# Altium footprint library SAMTEC SMD.PcbLib: 165 footprints (part 14 of 17) (continued)
## SAMTEC_SEAF-50-01-L-08-2-RA-GP-TR [mm] "400 Contacts in 8 rows (50 Pin per Row), Hi-Density Right Angle Open Pin Field Connector (Guide Post Option)" (continued)
  round 0.5 hole 1.3 unplated mask+0.4: MEC1(34.415,0) MEC2(-34.415,0)
  round 1.85 hole 1.15: MEC3(35.435,-6.16) MEC4(35.435,4.38) MEC5(-35.435,-6.16) MEC6(-35.435,4.38)
Top Overlay:
  lines w0.2: -35.179,6.463 -35.179,7.987 35.179,7.987 35.179,6.463 ; -35.014,-10.86 -34.95,-12.13 -33.172,-12.13 -33.109,-10.86 ; -34.867,7.987 -34.417,7.287 -33.967,7.987 ; -33.147,7.987 -33.147,6.463 -41.529,6.463 -41.529,-8.32 -35.09,-8.32 -35.09,-10.86 35.09,-10.86 35.09,-8.32 41.529,-8.32 41.529,6.463 33.147,6.463 33.147,7.987 ; -32.265,-2.732 -32.461,-2.732 -32.461,3.872 32.461,3.872 32.461,-2.732 31.605,-2.732 ; 31.852,-10.86 31.852,-2.732 ; 33.109,-10.86 33.172,-12.13 34.95,-12.13 35.014,-10.86
  text "400" at 33.825,-10.05 h1.2
  text "1" at -31.625,1.35 h1.2
Mechanical 8:
  drawing of 1707 lines, arcs and shapes, not listed
Mechanical 14:
  lines w0.1: -35.179,6.463 -35.179,7.987 35.179,7.987 35.179,6.463 ; -35.014,-10.86 -34.95,-12.13 -33.172,-12.13 -33.109,-10.86 ; -34.867,7.987 -34.417,7.287 -33.967,7.987 ; -33.147,7.987 -33.147,6.463 -41.529,6.463 -41.529,-8.32 -35.09,-8.32 -35.09,-10.86 35.09,-10.86 35.09,-8.32 41.529,-8.32 41.529,6.463 33.147,6.463 33.147,7.987 ; -31.852,-10.86 -31.852,-2.732 ; 31.852,-10.86 31.852,-2.732 ; 33.109,-10.86 33.172,-12.13 34.95,-12.13 35.014,-10.86 ; -32.461,-2.732 -32.461,3.872 32.461,3.872 32.461,-2.732 -32.461,-2.732
  text "400" at 33.825,-10.05 h1.2
  text "1" at -31.625,1.35 h1.2
Mechanical 15:
  lines w0.05: -41.779,-8.57 -35.34,-8.57 -35.34,-11.11 -35.252,-11.11 -35.188,-12.38 -32.935,-12.38 -32.871,-11.11 32.871,-11.11 32.935,-12.38 35.188,-12.38 35.252,-11.11 35.34,-11.11 35.34,-8.57 41.779,-8.57 41.779,6.713 35.429,6.713 35.429,8.237 -35.429,8.237 -35.429,6.713 -41.779,6.713 -41.779,-8.57
3D body "SAMTEC_SEAF-50-01-L-08-2-RA-GP-TR.stp": height 13, standoff -1.5, extent -41.529,-12.13 41.529,7.987

## SAMTEC_SEAF-50-01-L-08-2-RA-TR [mm] "400 Contacts in 8 rows (50 Pin per Row), Hi-Density Right Angle Open Pin Field Connector"
height 12.99
pads (406):
  oval 0.84x0.63 smd paste+0.1: 1(-31.445,0) 2(-31.445,-2.159) 3(-31.445,-3.43) 4(-31.445,-4.7) 5(-31.445,-5.97) 6(-31.445,-7.24) 7(-31.445,-8.51) 8(-31.445,-9.78) 9(-30.175,0) 10(-30.175,-2.159) 11(-30.175,-3.43) 12(-30.175,-4.7) 13(-30.175,-5.97) 14(-30.175,-7.24) 15(-30.175,-8.51) 16(-30.175,-9.78) 17(-28.905,0) 18(-28.905,-2.159) 19(-28.905,-3.43) 20(-28.905,-4.7) 21(-28.905,-5.97) 22(-28.905,-7.24) 23(-28.905,-8.51) 24(-28.905,-9.78) 25(-27.635,0) 26(-27.635,-2.159) 27(-27.635,-3.43) 28(-27.635,-4.7) 29(-27.635,-5.97) 30(-27.635,-7.24) 31(-27.635,-8.51) 32(-27.635,-9.78) 33(-26.365,0) 34(-26.365,-2.159) 35(-26.365,-3.43) 36(-26.365,-4.7) 37(-26.365,-5.97) 38(-26.365,-7.24) 39(-26.365,-8.51) 40(-26.365,-9.78) 41(-25.095,0) 42(-25.095,-2.159) 43(-25.095,-3.43) 44(-25.095,-4.7) 45(-25.095,-5.97) 46(-25.095,-7.24) 47(-25.095,-8.51) 48(-25.095,-9.78) 49(-23.825,0) 50(-23.825,-2.159) 51(-23.825,-3.43) 52(-23.825,-4.7) 53(-23.825,-5.97) 54(-23.825,-7.24) 55(-23.825,-8.51) 56(-23.825,-9.78) 57(-22.555,0) 58(-22.555,-2.159) 59(-22.555,-3.43) 60(-22.555,-4.7) 61(-22.555,-5.97) 62(-22.555,-7.24) 63(-22.555,-8.51) 64(-22.555,-9.78) 65(-21.285,0) 66(-21.285,-2.159) 67(-21.285,-3.43) 68(-21.285,-4.7) 69(-21.285,-5.97) 70(-21.285,-7.24) 71(-21.285,-8.51) 72(-21.285,-9.78) 73(-20.015,0) 74(-20.015,-2.159) 75(-20.015,-3.43) 76(-20.015,-4.7) 77(-20.015,-5.97) 78(-20.015,-7.24) 79(-20.015,-8.51) 80(-20.015,-9.78) 81(-18.745,0) 82(-18.745,-2.159) 83(-18.745,-3.43) 84(-18.745,-4.7) 85(-18.745,-5.97) 86(-18.745,-7.24) 87(-18.745,-8.51) 88(-18.745,-9.78) 89(-17.475,0) 90(-17.475,-2.159) 91(-17.475,-3.43) 92(-17.475,-4.7) 93(-17.475,-5.97) 94(-17.475,-7.24) 95(-17.475,-8.51) 96(-17.475,-9.78) 97(-16.205,0) 98(-16.205,-2.159) 99(-16.205,-3.43) 100(-16.205,-4.7) 101(-16.205,-5.97) 102(-16.205,-7.24) 103(-16.205,-8.51) 104(-16.205,-9.78) 105(-14.935,0) 106(-14.935,-2.159) 107(-14.935,-3.43) 108(-14.935,-4.7) 109(-14.935,-5.97) 110(-14.935,-7.24) 111(-14.935,-8.51) 112(-14.935,-9.78) 113(-13.665,0) 114(-13.665,-2.159) 115(-13.665,-3.43) 116(-13.665,-4.7) 117(-13.665,-5.97) 118(-13.665,-7.24) 119(-13.665,-8.51) 120(-13.665,-9.78) 121(-12.395,0) 122(-12.395,-2.159) 123(-12.395,-3.43) 124(-12.395,-4.7) 125(-12.395,-5.97) 126(-12.395,-7.24) 127(-12.395,-8.51) 128(-12.395,-9.78) 129(-11.125,0) 130(-11.125,-2.159) 131(-11.125,-3.43) 132(-11.125,-4.7) 133(-11.125,-5.97) 134(-11.125,-7.24) 135(-11.125,-8.51) 136(-11.125,-9.78) 137(-9.855,0) 138(-9.855,-2.159) 139(-9.855,-3.43) 140(-9.855,-4.7) 141(-9.855,-5.97) 142(-9.855,-7.24) 143(-9.855,-8.51) 144(-9.855,-9.78) 145(-8.585,0) 146(-8.585,-2.159) 147(-8.585,-3.43) 148(-8.585,-4.7) 149(-8.585,-5.97) 150(-8.585,-7.24) 151(-8.585,-8.51) 152(-8.585,-9.78) 153(-7.315,0) 154(-7.315,-2.159) 155(-7.315,-3.43) 156(-7.315,-4.7) 157(-7.315,-5.97) 158(-7.315,-7.24) 159(-7.315,-8.51) 160(-7.315,-9.78) 161(-6.045,0) 162(-6.045,-2.159) 163(-6.045,-3.43) 164(-6.045,-4.7) 165(-6.045,-5.97) 166(-6.045,-7.24) 167(-6.045,-8.51) 168(-6.045,-9.78) 169(-4.775,0) 170(-4.775,-2.159) 171(-4.775,-3.43) 172(-4.775,-4.7) 173(-4.775,-5.97) 174(-4.775,-7.24) 175(-4.775,-8.51) 176(-4.775,-9.78) 177(-3.505,0) 178(-3.505,-2.159) 179(-3.505,-3.43) 180(-3.505,-4.7) 181(-3.505,-5.97) 182(-3.505,-7.24) 183(-3.505,-8.51) 184(-3.505,-9.78) 185(-2.235,0) 186(-2.235,-2.159) 187(-2.235,-3.43) 188(-2.235,-4.7) 189(-2.235,-5.97) 190(-2.235,-7.24) 191(-2.235,-8.51) 192(-2.235,-9.78) 193(-0.965,0) 194(-0.965,-2.159) 195(-0.965,-3.43) 196(-0.965,-4.7) 197(-0.965,-5.97) 198(-0.965,-7.24) 199(-0.965,-8.51) 200(-0.965,-9.78) 201(0.305,0) 202(0.305,-2.159) 203(0.305,-3.43) 204(0.305,-4.7) 205(0.305,-5.97) 206(0.305,-7.24) 207(0.305,-8.51) 208(0.305,-9.78) 209(1.575,0) 210(1.575,-2.159) 211(1.575,-3.43) 212(1.575,-4.7) 213(1.575,-5.97) 214(1.575,-7.24) 215(1.575,-8.51) 216(1.575,-9.78) 217(2.845,0) 218(2.845,-2.159) 219(2.845,-3.43) 220(2.845,-4.7) 221(2.845,-5.97) 222(2.845,-7.24) 223(2.845,-8.51) 224(2.845,-9.78) 225(4.115,0) 226(4.115,-2.159) 227(4.115,-3.43) 228(4.115,-4.7) 229(4.115,-5.97) 230(4.115,-7.24) 231(4.115,-8.51) 232(4.115,-9.78) 233(5.385,0) 234(5.385,-2.159) 235(5.385,-3.43) 236(5.385,-4.7) 237(5.385,-5.97) 238(5.385,-7.24) 239(5.385,-8.51) 240(5.385,-9.78) 241(6.655,0) 242(6.655,-2.159) 243(6.655,-3.43) 244(6.655,-4.7) 245(6.655,-5.97) 246(6.655,-7.24) 247(6.655,-8.51) 248(6.655,-9.78) 249(7.925,0) 250(7.925,-2.159) 251(7.925,-3.43) 252(7.925,-4.7) 253(7.925,-5.97) 254(7.925,-7.24) 255(7.925,-8.51) 256(7.925,-9.78) 257(9.195,0) 258(9.195,-2.159) 259(9.195,-3.43) 260(9.195,-4.7) 261(9.195,-5.97) 262(9.195,-7.24) 263(9.195,-8.51) 264(9.195,-9.78) 265(10.465,0) 266(10.465,-2.159) 267(10.465,-3.43) 268(10.465,-4.7) 269(10.465,-5.97) 270(10.465,-7.24) 271(10.465,-8.51) 272(10.465,-9.78) 273(11.735,0) 274(11.735,-2.159) 275(11.735,-3.43) 276(11.735,-4.7) 277(11.735,-5.97) 278(11.735,-7.24) 279(11.735,-8.51) 280(11.735,-9.78) 281(13.005,0) 282(13.005,-2.159) 283(13.005,-3.43) 284(13.005,-4.7) 285(13.005,-5.97) 286(13.005,-7.24) 287(13.005,-8.51) 288(13.005,-9.78) 289(14.275,0) 290(14.275,-2.159) 291(14.275,-3.43) 292(14.275,-4.7) 293(14.275,-5.97) 294(14.275,-7.24) 295(14.275,-8.51) 296(14.275,-9.78) 297(15.545,0) 298(15.545,-2.159) 299(15.545,-3.43) 300(15.545,-4.7) 301(15.545,-5.97) 302(15.545,-7.24) 303(15.545,-8.51) 304(15.545,-9.78) 305(16.815,0) 306(16.815,-2.159) 307(16.815,-3.43) 308(16.815,-4.7) 309(16.815,-5.97) 310(16.815,-7.24) 311(16.815,-8.51) 312(16.815,-9.78) 313(18.085,0) 314(18.085,-2.159) 315(18.085,-3.43) 316(18.085,-4.7) 317(18.085,-5.97) 318(18.085,-7.24) 319(18.085,-8.51) 320(18.085,-9.78) 321(19.355,0) 322(19.355,-2.159) 323(19.355,-3.43) 324(19.355,-4.7) 325(19.355,-5.97) 326(19.355,-7.24) 327(19.355,-8.51) 328(19.355,-9.78) 329(20.625,0) 330(20.625,-2.159) 331(20.625,-3.43) 332(20.625,-4.7) 333(20.625,-5.97) 334(20.625,-7.24) 335(20.625,-8.51) 336(20.625,-9.78) 337(21.895,0) 338(21.895,-2.159) 339(21.895,-3.43) 340(21.895,-4.7) 341(21.895,-5.97) 342(21.895,-7.24) 343(21.895,-8.51) 344(21.895,-9.78) 345(23.165,0) 346(23.165,-2.159) 347(23.165,-3.43) 348(23.165,-4.7) 349(23.165,-5.97) 350(23.165,-7.24) 351(23.165,-8.51) 352(23.165,-9.78) 353(24.435,0) 354(24.435,-2.159) 355(24.435,-3.43) 356(24.435,-4.7) 357(24.435,-5.97) 358(24.435,-7.24) 359(24.435,-8.51) 360(24.435,-9.78) 361(25.705,0) 362(25.705,-2.159) 363(25.705,-3.43) 364(25.705,-4.7) 365(25.705,-5.97) 366(25.705,-7.24) 367(25.705,-8.51) 368(25.705,-9.78) 369(26.975,0) 370(26.975,-2.159) 371(26.975,-3.43) 372(26.975,-4.7) 373(26.975,-5.97) 374(26.975,-7.24) 375(26.975,-8.51) 376(26.975,-9.78) 377(28.245,0) 378(28.245,-2.159) 379(28.245,-3.43) 380(28.245,-4.7) 381(28.245,-5.97) 382(28.245,-7.24) 383(28.245,-8.51) 384(28.245,-9.78) 385(29.515,0) 386(29.515,-2.159) 387(29.515,-3.43) 388(29.515,-4.7) 389(29.515,-5.97) 390(29.515,-7.24) 391(29.515,-8.51) 392(29.515,-9.78) 393(30.785,0) 394(30.785,-2.159) 395(30.785,-3.43) 396(30.785,-4.7) 397(30.785,-5.97) 398(30.785,-7.24) 399(30.785,-8.51) 400(30.785,-9.78)
  round 0.5 hole 1.3 unplated mask+0.4: MEC1(34.415,0) MEC2(-34.415,0)
  round 1.85 hole 1.15: MEC3(35.435,-6.16) MEC4(35.435,4.38) MEC5(-35.435,-6.16) MEC6(-35.435,4.38)
Top Overlay:
  lines w0.2: -36.449,-7.013 -36.449,-8.32 -35.09,-8.32 -35.09,-10.86 35.09,-10.86 35.09,-8.32 36.449,-8.32 36.449,-7.013 ; -36.449,-5.307 -36.449,3.527 ; -36.449,5.233 -36.449,6.463 -33.147,6.463 -33.147,7.987 ; -35.179,6.463 -35.179,7.987 35.179,7.987 35.179,6.463 ; -35.014,-10.86 -34.95,-12.13 -33.172,-12.13 -33.109,-10.86 ; -34.867,7.987 -34.417,7.287 -33.967,7.987 ; -32.265,-2.732 -32.461,-2.732 -32.461,3.872 32.461,3.872 32.461,-2.732 31.605,-2.732 ; 31.852,-10.86 31.852,-2.732 ; 33.109,-10.86 33.172,-12.13 34.95,-12.13 35.014,-10.86 ; 33.147,7.987 33.147,6.463 36.449,6.463 36.449,5.233 ; 36.449,-5.307 36.449,3.527
  text "1" at -31.625,1.35 h1.2
  text "400" at 33.825,-10.05 h1.2
Mechanical 8:
  drawing of 1703 lines, arcs and shapes, not listed
Mechanical 14:
  lines w0.1: -35.179,6.463 -35.179,7.987 35.179,7.987 35.179,6.463 ; -35.014,-10.86 -34.95,-12.13 -33.172,-12.13 -33.109,-10.86 ; -34.867,7.987 -34.417,7.287 -33.967,7.987 ; -33.147,7.987 -33.147,6.463 -36.449,6.463 -36.449,-8.32 -35.09,-8.32 -35.09,-10.86 35.09,-10.86 35.09,-8.32 36.449,-8.32 36.449,6.463 33.147,6.463 33.147,7.987 ; -31.852,-10.86 -31.852,-2.732 ; 31.852,-10.86 31.852,-2.732 ; 33.109,-10.86 33.172,-12.13 34.95,-12.13 35.014,-10.86 ; -32.461,-2.732 -32.461,3.872 32.461,3.872 32.461,-2.732 -32.461,-2.732
  text "1" at -31.625,1.35 h1.2
  text "400" at 33.825,-10.05 h1.2
Mechanical 15:
  lines w0.05: -36.699,-8.57 -35.34,-8.57 -35.34,-11.11 -35.252,-11.11 -35.188,-12.38 -32.935,-12.38 -32.871,-11.11 32.871,-11.11 32.935,-12.38 35.188,-12.38 35.252,-11.11 35.34,-11.11 35.34,-8.57 36.699,-8.57 36.699,6.713 35.429,6.713 35.429,8.237 -35.429,8.237 -35.429,6.713 -36.699,6.713 -36.699,-8.57
3D body "SAMTEC_SEAF-50-01-L-08-2-RA-TR.stp": height 13, standoff -1.5, extent -36.449,-12.13 36.449,7.987

## SAMTEC_SEAM-20-11.0-S-10-2-A-K-TR [mm] "200 contacts (10 rows x 20 Columns) High Speed/High Density Open Field Board Stacking Male Connector"
height 13.6
pads (202):
  round 0.64 smd paste+0.125: 1(12.066,5.715) 2(12.066,4.445) 3(12.066,3.175) 4(12.066,1.905) 5(12.066,0.635) 6(12.066,-0.635) 7(12.066,-1.905) 8(12.066,-3.175) 9(12.066,-4.445) 10(12.066,-5.715) 11(10.796,5.715) 12(10.796,4.445) 13(10.796,3.175) 14(10.796,1.905) 15(10.796,0.635) 16(10.796,-0.635) 17(10.796,-1.905) 18(10.796,-3.175) 19(10.796,-4.445) 20(10.796,-5.715) 21(9.526,5.715) 22(9.526,4.445) 23(9.526,3.175) 24(9.526,1.905) 25(9.526,0.635) 26(9.526,-0.635) 27(9.526,-1.905) 28(9.526,-3.175) 29(9.526,-4.445) 30(9.526,-5.715) 31(8.256,5.715) 32(8.256,4.445) 33(8.256,3.175) 34(8.256,1.905) 35(8.256,0.635) 36(8.256,-0.635) 37(8.256,-1.905) 38(8.256,-3.175) 39(8.256,-4.445) 40(8.256,-5.715) 41(6.986,5.715) 42(6.986,4.445) 43(6.986,3.175) 44(6.986,1.905) 45(6.986,0.635) 46(6.986,-0.635) 47(6.986,-1.905) 48(6.986,-3.175) 49(6.986,-4.445) 50(6.986,-5.715) 51(5.716,5.715) 52(5.716,4.445) 53(5.716,3.175) 54(5.716,1.905) 55(5.716,0.635) 56(5.716,-0.635) 57(5.716,-1.905) 58(5.716,-3.175) 59(5.716,-4.445) 60(5.716,-5.715) 61(4.446,5.715) 62(4.446,4.445) 63(4.446,3.175) 64(4.446,1.905) 65(4.446,0.635) 66(4.446,-0.635) 67(4.446,-1.905) 68(4.446,-3.175) 69(4.446,-4.445) 70(4.446,-5.715) 71(3.176,5.715) 72(3.176,4.445) 73(3.176,3.175) 74(3.176,1.905) 75(3.176,0.635) 76(3.176,-0.635) 77(3.176,-1.905) 78(3.176,-3.175) 79(3.176,-4.445) 80(3.176,-5.715) 81(1.906,5.715) 82(1.906,4.445) 83(1.906,3.175) 84(1.906,1.905) 85(1.906,0.635) 86(1.906,-0.635) 87(1.906,-1.905) 88(1.906,-3.175) 89(1.906,-4.445) 90(1.906,-5.715) 91(0.636,5.715) 92(0.636,4.445) 93(0.636,3.175) 94(0.636,1.905) 95(0.636,0.635) 96(0.636,-0.635) 97(0.636,-1.905) 98(0.636,-3.175) 99(0.636,-4.445) 100(0.636,-5.715) 101(-0.634,5.715) 102(-0.634,4.445) 103(-0.634,3.175) 104(-0.634,1.905) 105(-0.634,0.635) 106(-0.634,-0.635) 107(-0.634,-1.905) 108(-0.634,-3.175) 109(-0.634,-4.445) 110(-0.634,-5.715) 111(-1.904,5.715) 112(-1.904,4.445) 113(-1.904,3.175) 114(-1.904,1.905) 115(-1.904,0.635) 116(-1.904,-0.635) 117(-1.904,-1.905) 118(-1.904,-3.175) 119(-1.904,-4.445) 120(-1.904,-5.715) 121(-3.174,5.715) 122(-3.174,4.445) 123(-3.174,3.175) 124(-3.174,1.905) 125(-3.174,0.635) 126(-3.174,-0.635) 127(-3.174,-1.905) 128(-3.174,-3.175) 129(-3.174,-4.445) 130(-3.174,-5.715) 131(-4.444,5.715) 132(-4.444,4.445) 133(-4.444,3.175) 134(-4.444,1.905) 135(-4.444,0.635) 136(-4.444,-0.635) 137(-4.444,-1.905) 138(-4.444,-3.175) 139(-4.444,-4.445) 140(-4.444,-5.715) 141(-5.714,5.715) 142(-5.714,4.445) 143(-5.714,3.175) 144(-5.714,1.905) 145(-5.714,0.635) 146(-5.714,-0.635) 147(-5.714,-1.905) 148(-5.714,-3.175) 149(-5.714,-4.445) 150(-5.714,-5.715) 151(-6.984,5.715) 152(-6.984,4.445) 153(-6.984,3.175) 154(-6.984,1.905) 155(-6.984,0.635) 156(-6.984,-0.635) 157(-6.984,-1.905) 158(-6.984,-3.175) 159(-6.984,-4.445) 160(-6.984,-5.715) 161(-8.254,5.715) 162(-8.254,4.445) 163(-8.254,3.175) 164(-8.254,1.905) 165(-8.254,0.635) 166(-8.254,-0.635) 167(-8.254,-1.905) 168(-8.254,-3.175) 169(-8.254,-4.445) 170(-8.254,-5.715) 171(-9.524,5.715) 172(-9.524,4.445) 173(-9.524,3.175) 174(-9.524,1.905) 175(-9.524,0.635) 176(-9.524,-0.635) 177(-9.524,-1.905) 178(-9.524,-3.175) 179(-9.524,-4.445) 180(-9.524,-5.715) 181(-10.794,5.715) 182(-10.794,4.445) 183(-10.794,3.175) 184(-10.794,1.905) 185(-10.794,0.635) 186(-10.794,-0.635) 187(-10.794,-1.905) 188(-10.794,-3.175) 189(-10.794,-4.445) 190(-10.794,-5.715) 191(-12.064,5.715) 192(-12.064,4.445) 193(-12.064,3.175) 194(-12.064,1.905) 195(-12.064,0.635) 196(-12.064,-0.635) 197(-12.064,-1.905) 198(-12.064,-3.175) 199(-12.064,-4.445) 200(-12.064,-5.715)
  round 0.5 hole 1.3 unplated mask+0.4: MEC1(-14.49,-3.05) MEC2(14.49,0)
Top Overlay:
  lines w0.2: -15.189,-6.579 -15.189,-4.044 ; -15.189,-1.758 -15.189,6.579 -14.427,7.341 ; -14.84,-7.976 14.84,-7.976 14.84,-6.928 ; -14.84,6.928 -14.84,7.976 14.84,7.976 14.84,6.928 ; -14.84,7.341 -14.427,7.341 ; -14.658,-4.04 -15.189,-4.572 -13.995,-4.572 ; -14.249,-4.572 -14.249,-5.74 -13.995,-5.486 -13.995,-4.044 ; -14.249,-1.758 -14.249,3.048 ; -14.249,4.572 -14.249,5.74 -13.995,5.486 -13.995,-1.758 ; -14.216,-4.033 -14.032,-4.572 ; -14.032,3.048 -14.235,3.641 ; -14.032,4.572 -14.235,3.979 ; -13.995,3.048 -15.189,3.048 -14.596,3.641 ; -13.995,4.572 -15.189,4.572 -14.596,3.979 ; -11.335,-7.798 -11.335,-6.731 11.335,-6.731 11.335,-7.798 ; -11.335,7.341 -13.621,7.341 -14.427,7.341 ; -11.335,7.798 -11.335,6.731 11.335,6.731 11.335,7.798 ; 11.335,-7.341 13.621,-7.341 14.427,-7.341 ; 11.335,7.341 13.621,7.341 14.427,7.341 ; 13.995,-2.007 15.189,-2.007 14.596,-1.424 14.235,-1.424 14.032,-2.007 ; 13.995,-1.414 13.995,-5.486 14.249,-5.74 14.249,-2.007 ; 13.995,1.414 13.995,5.486 14.249,5.74 14.249,2.007 ; 13.995,2.007 15.189,2.007 14.596,1.414 14.235,1.414 14.032,2.007 ; 14.84,-7.341 14.427,-7.341 ; 14.84,7.341 14.427,7.341 ; 15.189,-1.098 15.189,-6.579 14.427,-7.341 ; 15.189,1.392 15.189,6.579 14.427,7.341 ; -14.596,3.641 -14.235,3.641 ; -14.596,3.641 -14.596,3.979 ; -14.596,3.979 -14.235,3.979 ; -14.235,3.641 -14.235,3.979
  text "1" at 12.979,6.018 h1
  text "200" at -14.525,-7.509 h1
Mechanical 8:
  drawing of 1014 lines, arcs and shapes, not listed
Mechanical 14:
  lines w0.1: -14.84,-7.849 14.84,-7.849 ; -14.84,6.928 -14.84,7.976 14.84,7.976 14.84,6.928 ; -14.84,6.96 -14.808,6.96 ; -14.84,7.341 -14.427,7.341 ; -14.84,7.849 14.84,7.849 ; -14.249,-4.572 -14.249,-5.74 ; -14.249,-3.048 -14.249,3.048 ; -14.249,4.572 -14.249,5.74 ; -14.032,-4.572 -14.235,-3.979 ; -14.032,-3.048 -14.235,-3.641 ; -14.032,3.048 -14.235,3.641 ; -14.032,4.572 -14.235,3.979 ; -13.995,-4.572 -15.189,-4.572 -14.596,-3.979 ; -13.995,-3.048 -15.189,-3.048 -14.596,-3.641 ; -13.995,3.048 -15.189,3.048 -14.596,3.641 ; -13.995,4.572 -15.189,4.572 -14.596,3.979 ; -13.719,-4.541 13.078,-4.541 ; -13.718,3.079 13.079,3.079 ; -13.598,-4.42 -13.718,-4.54 -13.718,-3.073 ; -13.596,3.2 -13.716,3.08 -13.716,4.547 ; -13.083,-2.008 13.714,-2.008 ; -13.083,-0.535 13.714,-0.535 ; -13.083,0.532 13.714,0.532 ; -13.083,2.005 13.714,2.005 ; -12.958,-0.66 -13.081,-0.537 -13.081,-2.007 -12.954,-1.88 ; -12.958,1.88 -13.081,2.003 -13.081,0.533 -12.954,0.66 ; -12.935,7.341 -12.935,7.849 ; -11.335,-7.671 11.335,-7.671 ; -11.335,7.341 -13.621,7.341 -14.427,7.341 ; -11.335,7.671 11.335,7.671 ; 11.335,-7.341 13.621,-7.341 14.427,-7.341 ; 11.335,7.341 13.621,7.341 14.427,7.341 ; 12.935,-7.849 12.935,-7.341 ; 12.935,7.341 12.935,7.849 ; 12.959,-4.42 13.081,-4.541 13.081,-3.073 ; 12.961,3.2 13.083,3.079 13.083,4.547 ; 13.995,-2.007 15.189,-2.007 14.596,-1.424 ; 13.995,2.007 15.189,2.007 14.596,1.414 ; 14.032,-2.007 14.235,-1.424 ; 14.032,2.007 14.235,1.414 ; 14.235,-0.699 14.235,-1.424 ; 14.235,0.699 14.235,1.414 ; 14.249,-2.007 14.249,-5.74 ; 14.249,2.007 14.249,5.74 ; 14.596,-0.699 14.596,-1.424 ; 14.596,0.699 14.596,1.414 ; 14.808,-6.96 14.84,-6.96 ; 14.808,6.96 14.84,6.96 ; 14.84,-7.341 14.427,-7.341 ; 14.84,-6.928 14.84,-7.976 -14.84,-7.976 -14.84,-6.957 -15.189,-6.608 -15.189,6.579 -14.427,7.341 ; 14.84,7.341 14.427,7.341 ; 15.189,-0.699 13.995,-0.699 13.995,-5.486 ; 15.189,0.699 13.995,0.699 13.995,5.486 ; -14.596,-3.979 -14.596,-3.641 ; -14.596,-3.979 -14.235,-3.979 ; -14.596,-3.641 -14.235,-3.641 ; -14.596,3.641 -14.235,3.641 ; -14.596,3.641 -14.596,3.979 ; -14.596,3.979 -14.235,3.979 ; -14.249,-5.74 -13.995,-5.486 ; -14.249,-5.74 14.249,-5.74 ; -14.249,5.74 -13.995,5.486 ; -14.249,5.74 14.249,5.74 ; -14.235,-3.979 -14.235,-3.641 ; -14.235,3.641 -14.235,3.979 ; -13.995,-5.486 -13.995,5.486 ; -13.995,-5.486 13.995,-5.486 ; -13.995,5.486 13.995,5.486 ; -13.718,-3.073 13.079,-3.073 12.952,-3.2 ; -13.718,-3.073 -13.591,-3.2 ; -13.716,4.547 -13.589,4.42 ; -13.716,4.547 13.081,4.547 12.954,4.42 ; -13.591,-3.2 12.952,-3.2 ; -13.591,-3.2 -13.591,-4.42 12.952,-4.42 12.952,-3.2 ; -13.589,4.42 -13.589,3.2 12.954,3.2 12.954,4.42 ; -13.589,4.42 12.954,4.42 ; -12.954,-1.88 13.589,-1.88 ; -12.954,-1.88 -12.954,-0.66 13.589,-0.66 ; -12.954,0.66 -12.954,1.88 13.589,1.88 ; -12.954,0.66 13.589,0.66 ; 13.589,-1.88 13.589,-0.66 ; 13.589,-1.88 13.716,-2.007 13.716,-0.533 13.589,-0.66 ; 13.589,0.66 13.716,0.533 13.716,2.007 13.589,1.88 ; 13.589,0.66 13.589,1.88 ; 13.995,-5.486 14.249,-5.74 ; 13.995,5.486 14.249,5.74 ; 14.235,-1.424 14.596,-1.424 ; 14.235,1.414 14.596,1.414 ; 14.427,-7.341 15.189,-6.579 15.189,6.579 14.427,7.341 ; -11.335,-7.798 11.335,-7.798 11.335,-6.731 -11.335,-6.731 -11.335,-7.798 ; -11.335,6.731 11.335,6.731 11.335,7.798 -11.335,7.798 -11.335,6.731
  text "1" at 12.979,6.018 h1
  text "200" at -14.525,-7.509 h1
Mechanical 15:
  lines w0.1: -15.439,-8.226 15.439,-8.226 15.439,8.226 -15.439,8.226 -15.439,-8.226
3D body "SAMTEC_SEAM-20-11-S-10-2-A-K-TR.stp": height 14.6, standoff -1.27, extent -15.189,-7.975 15.189,7.976